# Altium footprint library pcb_Active.PcbLib: 86 footprints (part 4 of 6)
Each footprint in its own frame and in the unit in brackets; x right, y up, seen from the top. Pads: shape width x height; smd on the part's side, far side on the other; paste and mask are expansions set on the pad; w line width, h text height; cw(c..) or ccw(c..) is an arc to the next point about the centre after c.
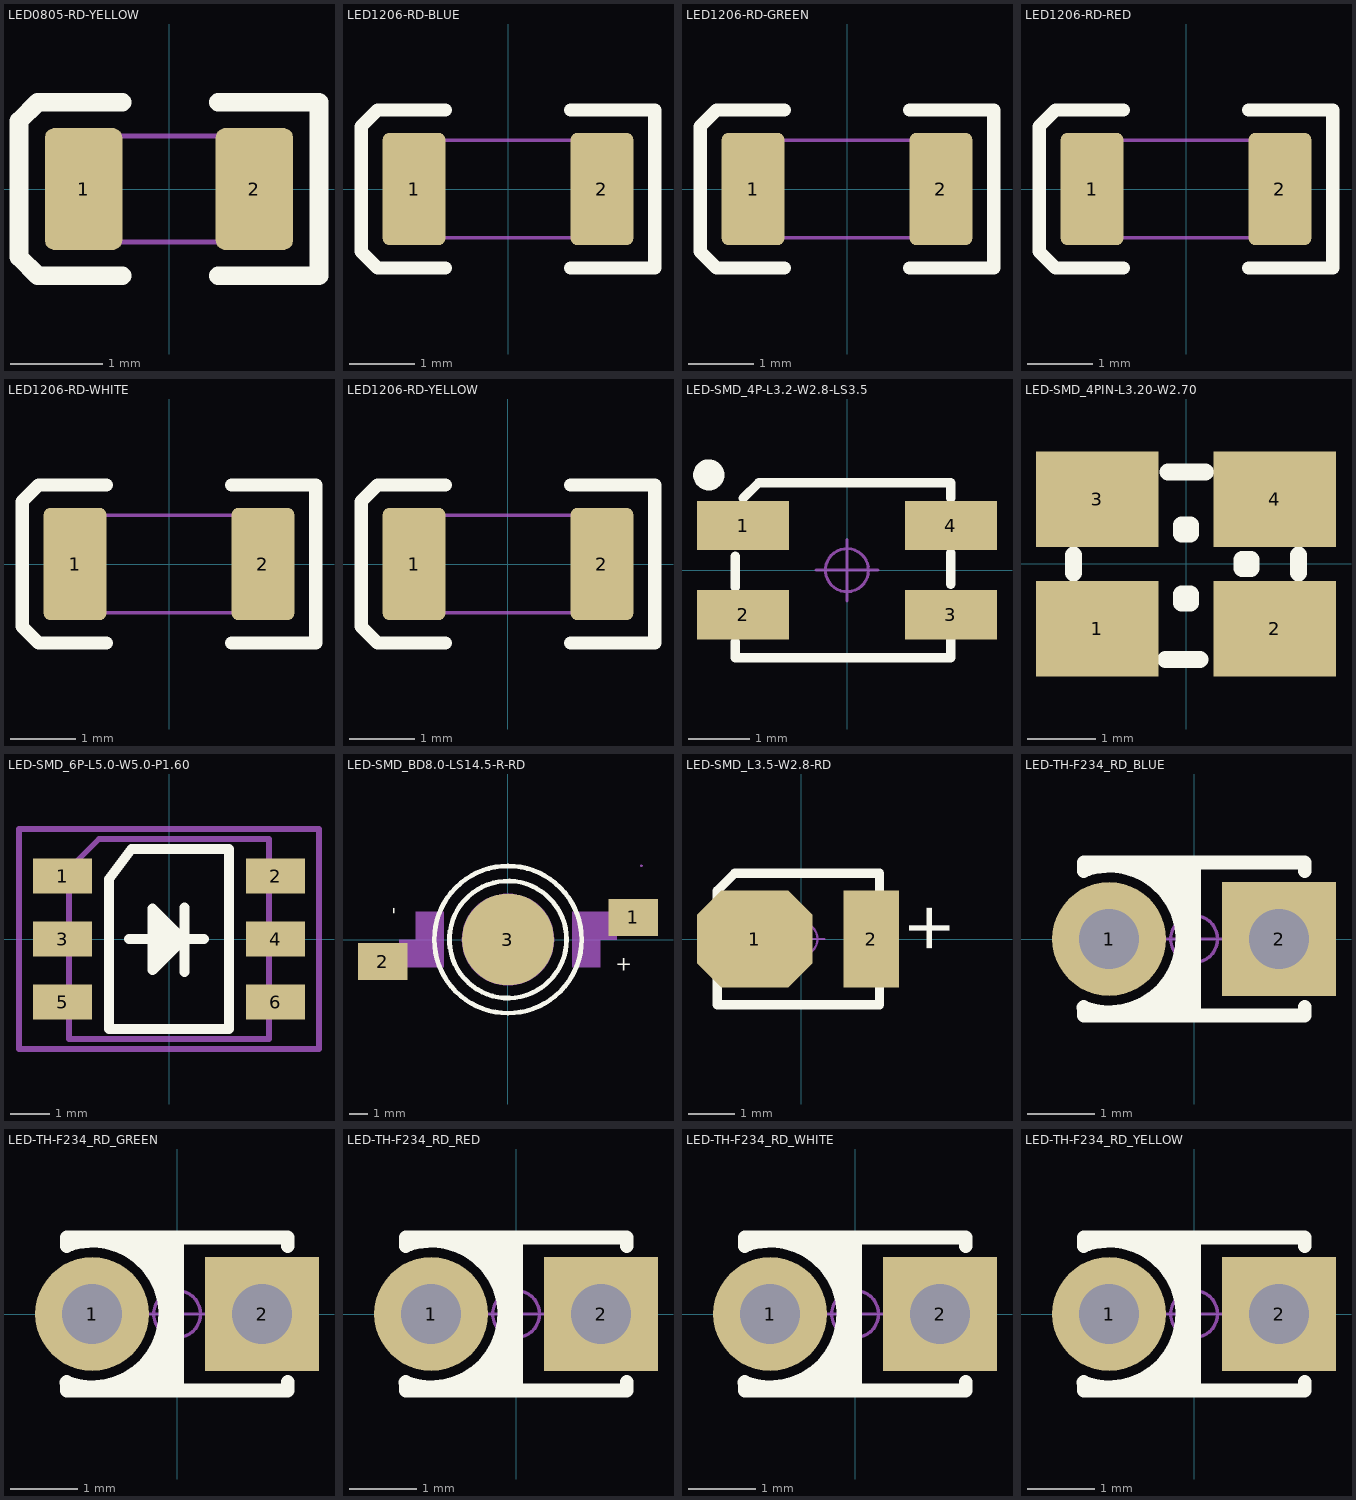
[diagram p3: the footprints below, top view; thin cyan lines are the x and y axes]

## LED0805-RD-YELLOW [mil]
height 47.24
pads (2):
  rrect24% 33x52 smd mask+3: 1(-36.42,0) 2(36.42,0)
Top Overlay:
  lines w8: -20,-37 -56,-37 -64,-29 -64,29 -56,37 -20,37 ; 21,-37 64,-37 64,37 21,37
Mechanical 11:
  lines w2.01: -37.4,-22.64 -37.4,22.64 37.4,22.64 37.4,-22.64 -37.4,-22.64
Mechanical 16:
  text ".Designator" at 0,0 h39.37
3D body "User Library-led_0805LED0805_yellow.STEP": height 43.31, standoff 0, extent -39.76,-24.61 39.76,24.61

## LED1206-RD-BLUE [mil]
height 47.24
pads (2):
  rrect20% 38x68 smd: 1(-57,0) 2(57,0)
Top Overlay:
  lines w8: -38,-48 -79,-48 -89,-38 -89,38 -79,48 -38,48 ; 38,-48 89,-48 89,48 38,48
Mechanical 11:
  lines w2.01: -59.06,-29.53 59.06,-29.53 59.06,29.53 -59.06,29.53 -59.06,-29.53
Mechanical 16:
  text ".Designator" at 0,0 h39.37
3D body "User Library-led_1206LED1206 blue.STEP": height 43.31, standoff 0, extent -63.39,-31.5 63.39,31.5

## LED1206-RD-GREEN [mil]
height 47.24
pads (2):
  rrect20% 38x68 smd: 1(-57,0) 2(57,0)
Top Overlay:
  lines w8: -38,-48 -79,-48 -89,-38 -89,38 -79,48 -38,48 ; 38,-48 89,-48 89,48 38,48
Mechanical 11:
  lines w2.01: -59.06,-29.53 59.06,-29.53 59.06,29.53 -59.06,29.53 -59.06,-29.53
Mechanical 16:
  text ".Designator" at 0,0 h39.37
3D body "User Library-led_1206LED1206 green.STEP": height 43.31, standoff 0, extent -63.39,-31.5 63.39,31.5

## LED1206-RD-RED [mil]
height 47.24
pads (2):
  rrect20% 38x68 smd: 1(-57,0) 2(57,0)
Top Overlay:
  lines w8: -38,-48 -79,-48 -89,-38 -89,38 -79,48 -38,48 ; 38,-48 89,-48 89,48 38,48
Mechanical 11:
  lines w2.01: -59.06,-29.53 59.06,-29.53 59.06,29.53 -59.06,29.53 -59.06,-29.53
Mechanical 16:
  text ".Designator" at 0,0 h39.37
3D body "User Library-led_1206LED1206 red.STEP": height 43.31, standoff 0, extent -63.39,-31.5 63.39,31.5

## LED1206-RD-WHITE [mil] "白色1206LED"
pads (2):
  rrect20% 38x68 smd: 1(-57,0) 2(57,0)
Top Overlay:
  lines w8: -38,-48 -79,-48 -89,-38 -89,38 -79,48 -38,48 ; 38,-48 89,-48 89,48 38,48
Mechanical 11:
  lines w2.01: -59.06,-29.53 -59.06,29.53 59.06,29.53 59.06,-29.53 -59.06,-29.53
Mechanical 16:
  text ".Designator" at 0,0 h39.37
3D body "LED 1206-W.STEP": height 35.55, standoff -0.16, extent -63.03,-31.54 63.03,31.54

## LED1206-RD-YELLOW [mil] "黄色1206LED"
pads (2):
  rrect20% 38x68 smd: 1(-57,0) 2(57,0)
Top Overlay:
  lines w8: -38,-48 -79,-48 -89,-38 -89,38 -79,48 -38,48 ; 38,-48 89,-48 89,48 38,48
Mechanical 11:
  lines w2.01: -59.05,-29.53 59.06,-29.53 59.06,29.53 -59.05,29.53 -59.05,-29.53
Mechanical 16:
  text ".Designator" at 0,0 h39.37
3D body "LED 1206-Y.STEP": height 35.55, standoff -0.16, extent -63.03,-31.54 63.03,31.54

## LED-SMD_4P-L3.2-W2.8-LS3.5 [mm] "4脚，3528LED"
pads (4):
  rect 1.5x0.8 smd: 1(-1.689,0.725) 2(-1.689,-0.725) 3(1.689,-0.725) 4(1.689,0.725)
Top Overlay:
  circle w0.254: c-2.248,1.549 r0.127
  lines w0.152: -1.816,-1.168 -1.816,-1.422 1.689,-1.422 1.689,-1.118 ; -1.816,-0.279 -1.816,0.229 ; -1.689,1.168 -1.435,1.422 1.689,1.422 1.689,1.168 ; 1.689,-0.229 1.689,0.279
Mechanical 15:
  circle w0.05: c0,0 r0.35
  lines w0.05: -0.5,0 0.5,0 ; 0,-0.5 0,0.5
Mechanical 16:
  text ".Designator" at 0,0 h1
3D body "LED 3528 透明胶.ST": height 1.95, standoff 1.2, extent -1.195,-1.186 1.195,1.186
3D body "LED 3528-4Pin 基体.STEP": height 1.95, standoff 0.05, extent -1.75,-1.4 1.75,1.4

## LED-SMD_4PIN-L3.20-W2.70 [mm]
pads (4):
  rect 1.8x1.4 smd: 1(-1.3,-0.95) 2(1.3,-0.95) 3(-1.3,0.95) 4(1.3,0.95)
Top Overlay:
  lines w0.254: -1.651,-0.127 -1.651,0.127 ; -0.3,-1.4 0.2,-1.4 ; -0.265,1.35 0.281,1.35 ; 1.651,-0.127 1.651,0.127 ; -0.064,-0.572 -0.064,-0.445 0.063,-0.445 0.063,-0.572 -0.064,-0.572 ; -0.064,0.444 -0.064,0.571 0.063,0.571 0.063,0.444 -0.064,0.444 ; 0.825,-0.064 0.825,0.063 0.952,0.063 0.952,-0.064 0.825,-0.064
Mechanical 16:
  text ".Designator" at 0,0 h1
3D body: height 0.8, standoff 0, extent -1.524,-1.397 1.524,1.397

## LED-SMD_6P-L5.0-W5.0-P1.60 [mm] "白色5050LED"
pads (6):
  rect 1.5x0.9 smd: 1(-2.705,1.6) 2(2.705,1.6) 3(-2.705,0) 4(2.705,0) 5(-2.705,-1.6) 6(2.705,-1.6)
Top Overlay:
  lines w0.254: -1.016,0 0.889,0 ; -0.254,0.559 -0.229,-0.432 0.254,0 0,0.254 0,0 0,-0.254 ; 0.356,-0.02 -0.417,-0.792 -0.417,0.775 0.396,-0.038 ; 0.396,-0.841 0.396,0.805 ; -1.524,-2.286 -1.524,1.524 -0.953,2.286 1.524,2.286 1.524,-2.286 -1.524,-2.286
Mechanical 13:
  lines w0.15: -2.54,-2.54 -2.54,1.778 -1.778,2.54 2.54,2.54 2.54,-2.54 -2.54,-2.54
Mechanical 15:
  circle w0.05: c0,0 r0.35
  lines w0.05: -0.5,0 0.5,0 ; 0,-0.5 0,0.5
  lines w0.15: -3.81,-2.794 -3.81,2.794 3.81,2.794 3.81,-2.794 -3.81,-2.794
Mechanical 16:
  text ".Designator" at 0,0 h1
3D body "LED 5050 基体.STEP": height 1.65, standoff 0.05, extent -2.7,-2.5 2.7,2.5
3D body "LED 5050 透明胶.ST": height 0, standoff 0, extent 0,0 0,0

## LED-SMD_BD8.0-LS14.5-R-RD [mm] "大功率LED"
pads (3):
  rect 2.7x2 smd paste+0 mask+0.05: 1(6.8,1.2) 2(-6.8,-1.2)
  round 5 smd paste+0 mask+0.05: 3(0,0)
Top Overlay:
  circle w0.254: c0,0 r3.182
  circle w0.254: c0,0 r4
  text "-" at -6.486,1.75 h0.78
  text "+" at 6.75,-1.014 h0.78
Mechanical 6:
  region: -6.125,-0.575 -6.125,-1.825 -6.375,-1.825 -6.375,-0.575
  region: 6.375,1.825 6.375,0.575 6.125,0.575 6.125,1.825
  region: 6.875,1.075 5.625,1.075 5.625,1.325 6.875,1.325
Mechanical 15:
  region: 7.31,4 7.309,4.024 7.274,4.058 7.226,4.058 7.191,4.024 7.19,4 7.191,3.976 7.226,3.942 7.274,3.942 7.309,3.976
  region: 7.25,1.95 5.85,1.95 5.85,1.2 5.85,0.45 7.25,0.45
  region: 5,1.5 5.9,1.5 5.9,0 5,0 5,-1.5 3.5,-1.5 3.5,1.5
  region: -5,-1.5 -5.9,-1.5 -5.9,0 -5,0 -5,1.5 -3.5,1.5 -3.5,-1.5
  region: -7.25,-1.95 -5.85,-1.95 -5.85,-1.2 -5.85,-0.45 -7.25,-0.45
  region: 2.5,0 2.499,0.245 2.401,0.726 2.211,1.179 1.937,1.586 1.589,1.932 1.18,2.204 0.727,2.391 0.245,2.486 -0.245,2.486 -0.727,2.391 -1.18,2.204 -1.589,1.932 -1.937,1.586 -2.211,1.179 -2.4,0.726 -2.498,0.245 -2.5,0 -2.498,-0.245 -2.4,-0.726 -2.211,-1.179 -1.937,-1.586 -1.589,-1.932 -1.18,-2.204 -0.727,-2.391 -0.245,-2.486 0.245,-2.486 0.727,-2.391 1.18,-2.204 1.589,-1.932 1.937,-1.586 2.211,-1.179 2.401,-0.726 2.499,-0.245
  lines w0.051: -4,0 cw(c0,0) 0,4 cw(c0,0) 4,0 cw(c0,0) 0,-4 cw(c0,0) -4,0
Mechanical 16:
  text ".Designator" at 0,0 h1
3D body "Unnamed-PCBModelAbll-LED1.step": height 5.2, standoff 0, extent -7.25,-3.989 7.25,3.989

## LED-SMD_L3.5-W2.8-RD [mm] "2脚，3528LED"
pads (2):
  oct 2.5x2.1 smd: 1(-1.003,0)
  rect 1.2x2.1 smd: 2(1.511,0)
Top Overlay:
  lines w0.2: -1.816,-1.422 1.689,-1.422 1.689,1.422 -1.435,1.422 -1.816,1.041 -1.816,-1.422
  text "+" at 3.213,-0.356 h1.02
Mechanical 15:
  circle w0.05: c0,0 r0.35
  lines w0.05: -0.5,0 0.5,0 ; 0,-0.5 0,0.5
Mechanical 16:
  text ".Designator" at 0,0 h1
3D body "LED 3528 透明胶.STEP": height 1.95, standoff 1.2, extent -1.245,-1.186 1.145,1.186
3D body "LED 3528-2Pin 基体.STEP": height 1.95, standoff 0.05, extent -1.8,-1.4 1.7,1.4

## LED-TH-F234_RD_BLUE [mm] "蓝色2mm*3mm*4mm(长*宽*高)"
pads (2):
  round 1.7 hole 0.9: 1(-1.27,0)
  rect 1.7x1.7 hole 0.9: 2(1.27,0)
Top Overlay:
  lines w0.203: -1.654,-1.023 ccw(c-1.27,0) -1.584,1.047 ; -1.651,-1.016 -1.651,-1.143 1.651,-1.143 1.651,-1.016 ; -1.651,1.016 -1.651,1.143 1.651,1.143 1.651,1.016 ; -0.762,-1.143 0,-0.381 ; -0.762,1.143 0,0.381 ; -0.508,-1.143 0,-0.635 ; -0.508,1.143 0,0.635 ; -0.254,-1.143 0,-0.889 ; -0.254,1.143 0,0.889 ; -0.127,-0.508 -0.127,0.635 ; 0,-1.143 0,1.143
Mechanical 15:
  circle w0.05: c0,0 r0.35
  lines w0.05: -0.5,0 0.5,0 ; 0,-0.5 0,0.5
Mechanical 16:
  text ".Designator" at 0,0 h1
3D body "LED F234-B.STEP": height 3.01, standoff -3.45, extent -1.52,-0.833 1.52,0.833
3D body "LED F234透明罩.STEP": height 4.05, standoff 0.05, extent -1.5,-1 1.5,1

## LED-TH-F234_RD_GREEN [mm] "绿色2mm*3mm*4mm(长*宽*高)"
pads (2):
  round 1.7 hole 0.9: 1(-1.27,0)
  rect 1.7x1.7 hole 0.9: 2(1.27,0)
Top Overlay:
  lines w0.203: -1.654,-1.023 ccw(c-1.27,0) -1.584,1.047 ; -1.651,-1.016 -1.651,-1.143 1.651,-1.143 1.651,-1.016 ; -1.651,1.016 -1.651,1.143 1.651,1.143 1.651,1.016 ; -0.762,-1.143 0,-0.381 ; -0.762,1.143 0,0.381 ; -0.508,-1.143 0,-0.635 ; -0.508,1.143 0,0.635 ; -0.254,-1.143 0,-0.889 ; -0.254,1.143 0,0.889 ; -0.127,-0.508 -0.127,0.635 ; 0,-1.143 0,1.143
Mechanical 15:
  circle w0.05: c0,0 r0.35
  lines w0.05: -0.5,0 0.5,0 ; 0,-0.5 0,0.5
Mechanical 16:
  text ".Designator" at 0,0 h1
3D body "LED F234-G.STEP": height 3.01, standoff -3.45, extent -1.52,-0.833 1.52,0.833
3D body "LED F234透明罩.STEP": height 4.05, standoff 0.05, extent -1.5,-1 1.5,1

## LED-TH-F234_RD_RED [mm] "红色2mm*3mm*4mm(长*宽*高)"
pads (2):
  round 1.7 hole 0.9: 1(-1.27,0)
  rect 1.7x1.7 hole 0.9: 2(1.27,0)
Top Overlay:
  lines w0.203: -1.654,-1.023 ccw(c-1.27,0) -1.584,1.047 ; -1.651,-1.016 -1.651,-1.143 1.651,-1.143 1.651,-1.016 ; -1.651,1.016 -1.651,1.143 1.651,1.143 1.651,1.016 ; -0.762,-1.143 0,-0.381 ; -0.762,1.143 0,0.381 ; -0.508,-1.143 0,-0.635 ; -0.508,1.143 0,0.635 ; -0.254,-1.143 0,-0.889 ; -0.254,1.143 0,0.889 ; -0.127,-0.508 -0.127,0.635 ; 0,-1.143 0,1.143
Mechanical 15:
  circle w0.05: c0,0 r0.35
  lines w0.05: -0.5,0 0.5,0 ; 0,-0.5 0,0.5
Mechanical 16:
  text ".Designator" at 0,0 h1
3D body "LED F234透明罩.STEP": height 4.05, standoff 0.05, extent -1.5,-1 1.5,1
3D body "LED F234-R.STEP": height 3.01, standoff -3.45, extent -1.52,-0.833 1.52,0.833

## LED-TH-F234_RD_WHITE [mm] "透明色2mm*3mm*4mm(长*宽*高)"
pads (2):
  round 1.7 hole 0.9: 1(-1.27,0)
  rect 1.7x1.7 hole 0.9: 2(1.27,0)
Top Overlay:
  lines w0.203: -1.654,-1.023 ccw(c-1.27,0) -1.584,1.047 ; -1.651,-1.016 -1.651,-1.143 1.651,-1.143 1.651,-1.016 ; -1.651,1.016 -1.651,1.143 1.651,1.143 1.651,1.016 ; -0.762,-1.143 0,-0.381 ; -0.762,1.143 0,0.381 ; -0.508,-1.143 0,-0.635 ; -0.508,1.143 0,0.635 ; -0.254,-1.143 0,-0.889 ; -0.254,1.143 0,0.889 ; -0.127,-0.508 -0.127,0.635 ; 0,-1.143 0,1.143
Mechanical 15:
  circle w0.05: c0,0 r0.35
  lines w0.05: -0.5,0 0.5,0 ; 0,-0.5 0,0.5
Mechanical 16:
  text ".Designator" at 0,0 h1
3D body "LED F234-W.STEP": height 3.01, standoff -3.45, extent -1.52,-0.833 1.52,0.833
3D body "LED F234透明罩.STEP": height 4.05, standoff 0.05, extent -1.5,-1 1.5,1

## LED-TH-F234_RD_YELLOW [mm] "黄色2mm*3mm*4mm(长*宽*高)"
pads (2):
  round 1.7 hole 0.9: 1(-1.27,0)
  rect 1.7x1.7 hole 0.9: 2(1.27,0)
Top Overlay:
  lines w0.203: -1.654,-1.023 ccw(c-1.27,0) -1.584,1.047 ; -1.651,-1.016 -1.651,-1.143 1.651,-1.143 1.651,-1.016 ; -1.651,1.016 -1.651,1.143 1.651,1.143 1.651,1.016 ; -0.762,-1.143 0,-0.381 ; -0.762,1.143 0,0.381 ; -0.508,-1.143 0,-0.635 ; -0.508,1.143 0,0.635 ; -0.254,-1.143 0,-0.889 ; -0.254,1.143 0,0.889 ; -0.127,-0.508 -0.127,0.635 ; 0,-1.143 0,1.143
Mechanical 15:
  circle w0.05: c0,0 r0.35
  lines w0.05: -0.5,0 0.5,0 ; 0,-0.5 0,0.5
Mechanical 16:
  text ".Designator" at 0,0 h1
3D body "LED F234透明罩.STEP": height 4.05, standoff 0.05, extent -1.5,-1 1.5,1
3D body "LED F234-Y.STEP": height 3.01, standoff -3.45, extent -1.52,-0.833 1.52,0.833